# Altium footprint library main.PcbLib: 217 footprints (part 12 of 14)
Each footprint in its own frame and in the unit in brackets; x right, y up, seen from the top. Pads: shape width x height; smd on the part's side, far side on the other; paste and mask are expansions set on the pad; w line width, h text height; cw(c..) or ccw(c..) is an arc to the next point about the centre after c.
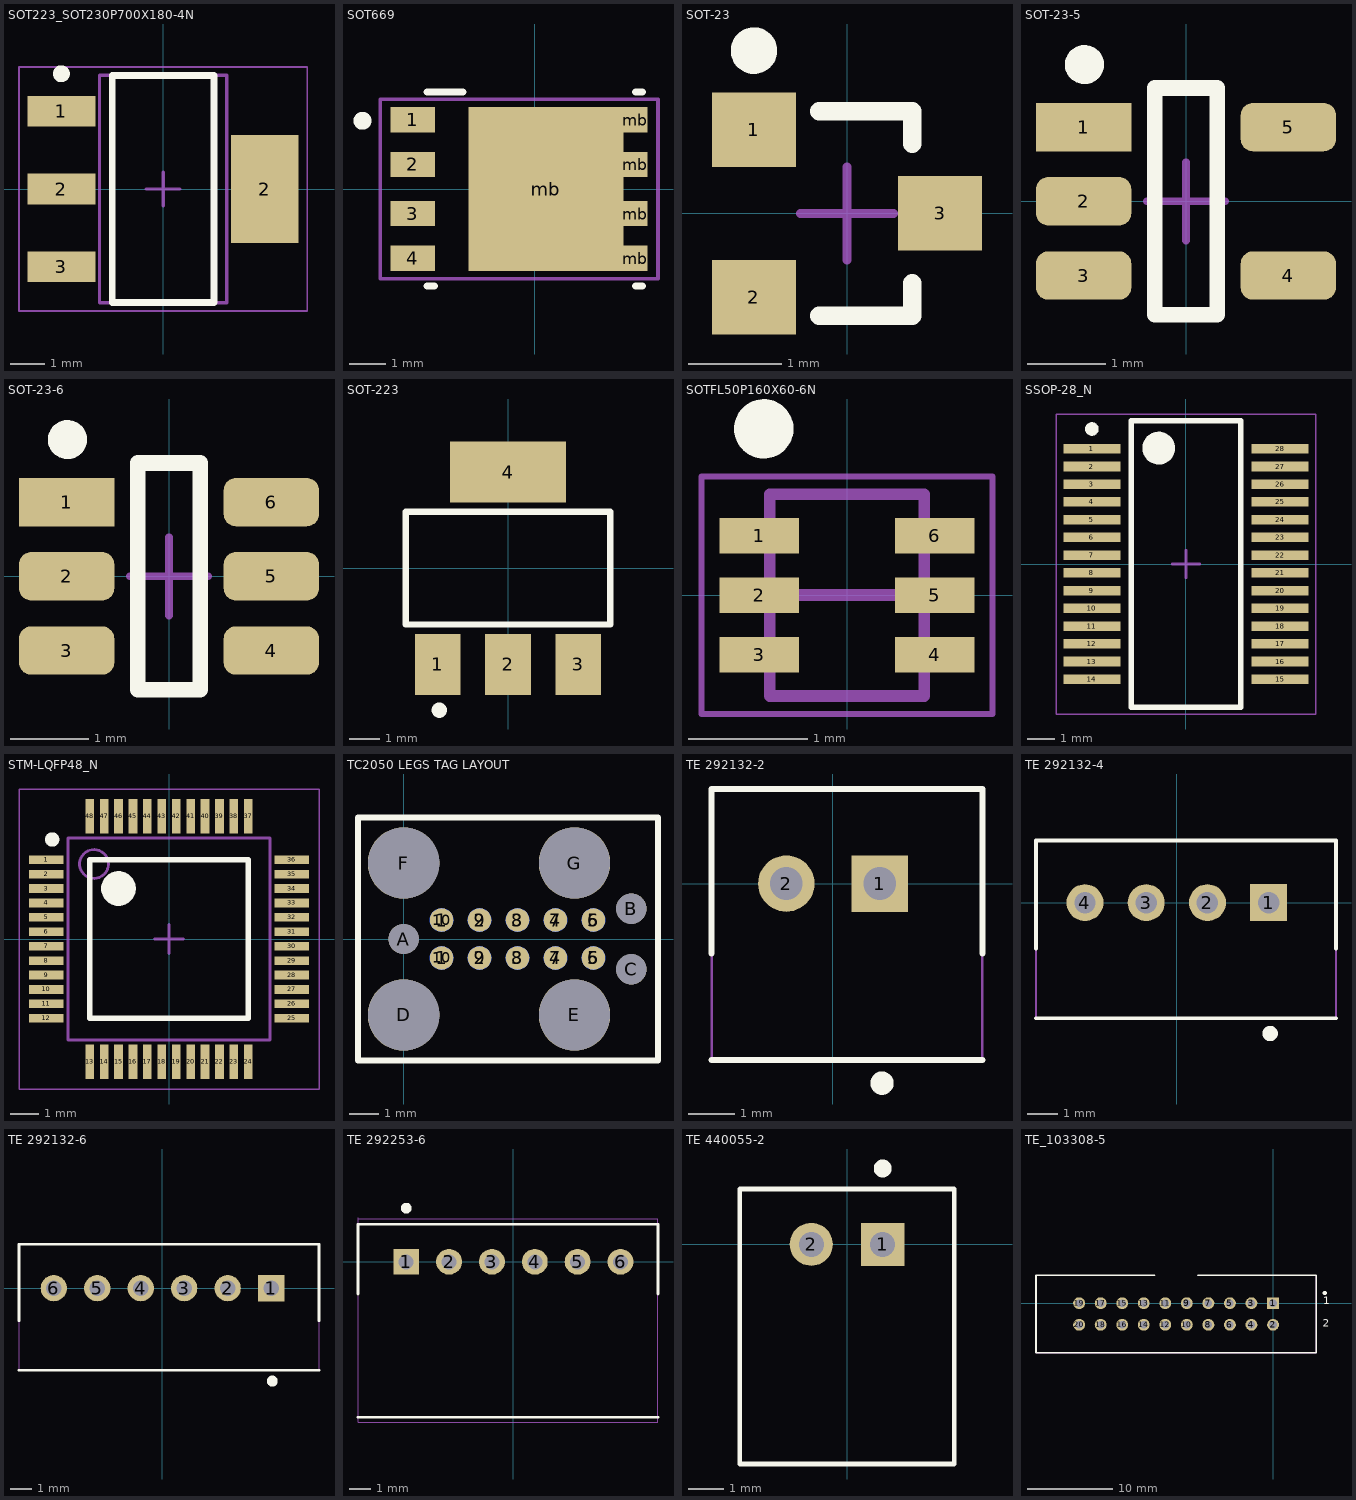
[diagram p11: the footprints below, top view; thin cyan lines are the x and y axes]

## SOT223_SOT230P700X180-4N [mm] "SOT223, 4-Leads, Body 6.50x7.00mm (avg), Pitch 2.30mm, IPC Medium Density"
height 1.8
pads (4):
  rect 2x0.9 smd: 1(-3,2.3) 2(-3,0) 3(-3,-2.3)
  rect 2x3.2 smd: 2(3,0)
Top Overlay:
  circle w0.25: c-3,3.4 r0.125
  lines w0.2: -1.5,-3.35 -1.5,3.35 1.5,3.35 1.5,-3.35 -1.5,-3.35
Mechanical 7:
  text ".Designator" at -2.286,-0.508 h1.52
Mechanical 13:
  lines w0.1: -1.875,-3.35 -1.875,3.35 1.875,3.35 1.875,-3.35 -1.875,-3.35
Mechanical 15:
  lines w0.05: -4.25,-3.6 -4.25,3.6 4.25,3.6 4.25,-3.6 -4.25,-3.6
  lines w0.1: -0.5,0 0.5,0 ; 0,-0.5 0,0.5
3D body: height 1.8, standoff 0.02, extent -1.875,-3.35 1.875,3.35

## SOT669 [mm] "SOT669"
height 0.025
pads (9):
  rect 1.25x0.7 smd paste-0.09: 1(-3.4,1.93) 2(-3.4,0.685) 3(-3.4,-0.685) 4(-3.4,-1.93)
  rect 4.32x4.56 smd paste+0: mb(0.308,0)
  rect 0.68x0.7 smd paste-0.09: mb(2.795,-1.93) mb(2.795,-0.685) mb(2.795,0.685) mb(2.795,1.93)
Top Overlay:
  circle w0.25: c-4.8,1.9 r0.125
  lines w0.2: -3,-2.7 -2.8,-2.7 ; -3,2.7 -2,2.7 ; 2.8,-2.7 3,-2.7 ; 2.8,2.7 3,2.7
Top Paste:
  rectangle: -1.392,0.385 0.193,1.955
  rectangle: -1.392,-1.955 0.193,-0.385
  rectangle: 0.693,0.385 1.927,1.955
  rectangle: 0.693,-1.955 1.927,-0.385
Top Solder:
  region: 2.25,-0.43 2.25,-0.84 2.475,-0.84 2.475,-0.43
  region: 2.25,-1.7 2.25,-2.11 2.475,-2.11 2.475,-1.7
  region: 2.25,2.11 2.25,1.7 2.475,1.7 2.475,2.11
  region: 2.25,0.84 2.25,0.43 2.475,0.43 2.475,0.84
  region: -1.189,-2.193 -1.19,-2.183 -1.19,2.183 -1.189,2.193 -1.186,2.203 -1.181,2.212 -1.175,2.22 -1.167,2.226 -1.158,2.231 -1.148,2.234 -1.138,2.235 2.238,2.235 2.248,2.234 2.258,2.231 2.267,2.226 2.275,2.22 2.281,2.212 2.286,2.203 2.289,2.193 2.29,2.183 2.29,-2.183 2.289,-2.193 2.286,-2.203 2.281,-2.212 2.275,-2.22 2.267,-2.226 2.258,-2.231 2.248,-2.234 2.238,-2.235 -1.138,-2.235 -1.148,-2.234 -1.158,-2.231 -1.167,-2.226 -1.175,-2.22 -1.181,-2.212 -1.186,-2.203
Mechanical 7:
  text ".Designator" at -2.413,-1.778 h1.52
Mechanical 15:
  lines w0.1: -4.3,-2.5 -4.3,2.5 3.429,2.5 3.429,-2.5 -4.3,-2.5
3D body "SOT669.step": height 1, standoff 0, extent -3.3,-2.405 2.81,2.405

## SOT-23 [mm]
height 1.1
pads (3):
  rect 0.9x0.8 smd: 1(-1,0.9) 2(-1,-0.9) 3(1,0)
Top Overlay:
  circle w0.25: c-1,1.75 r0.125
  lines w0.2: -0.3,-1.1 0.7,-1.1 0.7,-0.75 ; -0.3,1.1 0.7,1.1 0.7,0.75
Mechanical 15:
  lines w0.1: -0.5,0 0.5,0 ; 0,-0.5 0,0.5
3D body "SW3DPS-SOT-23-DEFAULT.STEP": height 1.05, standoff -0.05, extent -1.25,-1.5 1.25,1.5

## SOT-23-5 [mm]
height 1.1
pads (5):
  rect 1.22x0.62 smd: 1(-1.31,0.95)
  rrect50% 1.22x0.62 smd: 2(-1.31,0) 3(-1.31,-0.95) 4(1.31,-0.95) 5(1.31,0.95)
Top Overlay:
  circle w0.25: c-1.3,1.75 r0.125
  lines w0.2: -0.4,-1.45 0.4,-1.45 0.4,1.45 -0.4,1.45 -0.4,-1.45
Mechanical 15:
  lines w0.1: -0.5,0 0.5,0 ; 0,-0.5 0,0.5
3D body "User Library-SOT23-5-2.STEP": height 1.45, standoff 0, extent -1.4,-1.45 1.4,1.45

## SOT-23-6 [mm]
height 1.1
pads (6):
  rect 1.22x0.62 smd: 1(-1.31,0.95)
  rrect50% 1.22x0.62 smd: 2(-1.31,0) 3(-1.31,-0.95) 4(1.31,-0.95) 5(1.31,0) 6(1.31,0.95)
Top Overlay:
  circle w0.25: c-1.3,1.75 r0.125
  lines w0.2: -0.4,-1.45 -0.4,1.45 0.4,1.45 0.4,-1.45 -0.4,-1.45
Mechanical 15:
  lines w0.1: -0.5,0 0.5,0 ; 0,-0.5 0,0.5
3D body "User Library-SOT23-6-2.STEP": height 1.45, standoff 0, extent -1.4,-1.45 1.4,1.45

## SOT-223 [mm]
height 1.1
pads (4):
  rect 1.5x2 smd: 1(-2.3,-3.15) 2(0,-3.15) 3(2.3,-3.15)
  rect 3.8x2 smd: 4(0,3.15)
Top Overlay:
  circle w0.25: c-2.25,-4.65 r0.125
  lines w0.2: -3.35,-1.85 -3.35,1.85 3.35,1.85 3.35,-1.85 -3.35,-1.85
Mechanical 15:
  lines w0.1: -0.5,-3.15 0.5,-3.15 ; 0,-3.65 0,-2.65
3D body "User Library-SOT-223-4.STEP": height 1.65, standoff 0, extent -3.25,-3.543 3.25,3.544

## SOTFL50P160X60-6N [mm] "SOTFL, 6-Leads, Body 1.60x1.60mm, Pitch 0.50mm, IPC Medium Density"
height 0.6
pads (6):
  rect 0.67x0.3 smd: 1(-0.74,0.5) 2(-0.74,0) 3(-0.74,-0.5) 4(0.74,-0.5) 5(0.74,0) 6(0.74,0.5)
Top Overlay:
  circle w0.25: c-0.7,1.4 r0.125
Mechanical 7:
  text ".Designator" at -0.74,-0.5 h0.6
Mechanical 13:
  lines w0.1: -0.65,-0.85 0.65,-0.85 0.65,0.85 -0.65,0.85 -0.65,-0.85
Mechanical 15:
  lines w0.05: -1.225,-1 1.225,-1 1.225,1 -1.225,1 -1.225,-1
  lines w0.1: -0.5,0 0.5,0
3D body: height 0.6, standoff 0, extent -0.65,-0.85 0.65,0.85

## SSOP-28_N [mm] "SOP, 28-Leads, Body 10.2x5.3mm, Pitch 0.65mm, IPC Medium Density"
height 2
pads (28):
  rect 2.1x0.35 smd: 1(-3.45,4.225) 2(-3.45,3.575) 3(-3.45,2.925) 4(-3.45,2.275) 5(-3.45,1.625) 6(-3.45,0.975) 7(-3.45,0.325) 8(-3.45,-0.325) 9(-3.45,-0.975) 10(-3.45,-1.625) 11(-3.45,-2.275) 12(-3.45,-2.925) 13(-3.45,-3.575) 14(-3.45,-4.225) 15(3.45,-4.225) 16(3.45,-3.575) 17(3.45,-2.925) 18(3.45,-2.275) 19(3.45,-1.625) 20(3.45,-0.975) 21(3.45,-0.325) 22(3.45,0.325) 23(3.45,0.975) 24(3.45,1.625) 25(3.45,2.275) 26(3.45,2.925) 27(3.45,3.575) 28(3.45,4.225)
Top Overlay:
  circle w0.25: c-3.45,4.95 r0.125
  circle w0.6: c-1,4.25 r0.3
  lines w0.2: -2,-5.25 -2,5.25 2,5.25 2,-5.25 -2,-5.25
Mechanical 7:
  text ".Designator" at -0.827,-0.953 h0.76
Mechanical 15:
  lines w0.05: -4.75,-5.5 -4.75,5.5 4.75,5.5 4.75,-5.5 -4.75,-5.5
  lines w0.1: -0.5,0 0.5,0 ; 0,-0.5 0,0.5
3D body "User Library-ssop28_model.STEP": height 1.96, standoff -0.04, extent -3.928,-5.071 3.872,5.129

## STM-LQFP48_N [mm] "QFP, 48-Leads, Body 7x7mm, Pitch 0.5mm, IPC Medium Density"
height 1.6
pads (48):
  rect 1.2x0.3 smd: 1(-4.25,2.75) 2(-4.25,2.25) 3(-4.25,1.75) 4(-4.25,1.25) 5(-4.25,0.75) 6(-4.25,0.25) 7(-4.25,-0.25) 8(-4.25,-0.75) 9(-4.25,-1.25) 10(-4.25,-1.75) 11(-4.25,-2.25) 12(-4.25,-2.75) 25(4.25,-2.75) 26(4.25,-2.25) 27(4.25,-1.75) 28(4.25,-1.25) 29(4.25,-0.75) 30(4.25,-0.25) 31(4.25,0.25) 32(4.25,0.75) 33(4.25,1.25) 34(4.25,1.75) 35(4.25,2.25) 36(4.25,2.75)
  rect 0.3x1.2 smd: 13(-2.75,-4.25) 14(-2.25,-4.25) 15(-1.75,-4.25) 16(-1.25,-4.25) 17(-0.75,-4.25) 18(-0.25,-4.25) 19(0.25,-4.25) 20(0.75,-4.25) 21(1.25,-4.25) 22(1.75,-4.25) 23(2.25,-4.25) 24(2.75,-4.25) 37(2.75,4.25) 38(2.25,4.25) 39(1.75,4.25) 40(1.25,4.25) 41(0.75,4.25) 42(0.25,4.25) 43(-0.25,4.25) 44(-0.75,4.25) 45(-1.25,4.25) 46(-1.75,4.25) 47(-2.25,4.25) 48(-2.75,4.25)
Top Overlay:
  circle w0.25: c-4.05,3.45 r0.125
  circle w0.6: c-1.75,1.75 r0.3
  lines w0.2: -2.75,-2.75 -2.75,2.75 2.75,2.75 2.75,-2.75 -2.75,-2.75
Mechanical 7:
  text ".Designator" at -2.166,-1.342 h0.76
Mechanical 13:
  circle w0.1: c-2.6,2.6 r0.5
  lines w0.1: -3.5,-3.5 -3.5,3.5 3.5,3.5 3.5,-3.5 -3.5,-3.5
Mechanical 15:
  lines w0.05: -5.2,-5.2 -5.2,5.2 5.2,5.2 5.2,-5.2 -5.2,-5.2
  lines w0.1: -0.5,0 0.5,0 ; 0,-0.5 0,0.5
3D body "User Library-LQFP48_Grid_0_5.STEP": height 1.6, standoff 0, extent -4.5,-4.5 4.5,4.5

## TC2050 LEGS TAG LAYOUT [mil]
height 1
pads (27):
  round 31 smd paste-31: 1(50,-25) 2(100,-25) 3(150,-25) 4(200,-25) 5(250,-25) 6(250,25) 7(200,25) 8(150,25) 9(100,25) 10(50,25)
  round 31 smd far side paste-31: 1(50,25) 2(100,25) 3(150,25) 4(200,25) 5(250,25) 6(250,-25) 7(200,-25) 8(150,-25) 9(100,-25) 10(50,-25)
  round 40 hole 40 unplated: A(0,0) B(300,40) C(300,-40)
  round 94 hole 94 unplated: D(0,-100) E(225,-100) F(0,100) G(225,100)
Top Overlay:
  lines w7.87: -60,-160 -60,160 335,160 335,-160 -60,-160
Mechanical 7:
  text ".Designator" at 66.93,-78.74 h30

## TE 292132-2 [mm] "TE 292132-2"
pads (2):
  rect 1.208x1.208 hole 0.7: 1(1,0)
  round 1.208 hole 0.7: 2(-1,0)
Top Overlay:
  circle w0.25: c1.05,-4.275 r0.125
  lines w0.127: -2.6,-3.775 3.2,-3.775 ; -2.6,-1.5 -2.6,2.025 3.2,2.025 3.2,-1.5
Mechanical 7:
  text ".Designator" at -4.548,-1.037 h1.52
Mechanical 15:
  lines w0.05: -2.6,-3.775 -2.6,2.025 3.2,2.025 3.2,-3.775 -2.6,-3.775
3D body "c-292132-2-b1-3d.stp": height 6.8, standoff -3.2, extent -2.6,-3.775 3.2,2.025

## TE 292132-4 [mm] "TE 292132-4"
pads (4):
  rect 1.208x1.208 hole 0.7: 1(3,0)
  round 1.208 hole 0.7: 2(1,0) 3(-1,0) 4(-3,0)
Top Overlay:
  circle w0.25: c3.05,-4.275 r0.125
  lines w0.127: -4.6,-3.775 5.2,-3.775 ; -4.6,-1.5 -4.6,2.025 5.2,2.025 5.2,-1.5
Mechanical 7:
  text ".Designator" at -2.548,-1.037 h1.52
Mechanical 15:
  lines w0.05: -4.6,-3.775 -4.6,2.025 5.2,2.025 5.2,-3.775 -4.6,-3.775
3D body "c-292132-4-b1-3d.stp": height 6.8, standoff -3.2, extent -4.6,-3.775 5.2,2.025

## TE 292132-6 [mm] "TE 292132-6"
pads (6):
  rect 1.208x1.208 hole 0.7: 1(5,0)
  round 1.208 hole 0.7: 2(3,0) 3(1,0) 4(-1,0) 5(-3,0) 6(-5,0)
Top Overlay:
  circle w0.25: c5.05,-4.275 r0.125
  lines w0.127: -6.6,-3.775 7.2,-3.775 ; -6.6,-1.5 -6.6,2.025 7.2,2.025 7.2,-1.5
Mechanical 7:
  text ".Designator" at -0.548,-1.037 h1.52
Mechanical 15:
  lines w0.05: -6.6,-3.775 -6.6,2.025 ; -2.6,-3.775 7.2,-3.775 7.2,2.025 -2.6,2.025
3D body "c-292132-6-b1-3d.stp": height 6.8, standoff -3.2, extent -6.6,-3.775 7.2,2.025

## TE 292253-6 [mm] "TE 292253-6"
pads (6):
  rect 1.208x1.208 hole 0.7: 1(-5,0)
  round 1.208 hole 0.7: 2(-3,0) 3(-1,0) 4(1,0) 5(3,0) 6(5,0)
Top Overlay:
  circle w0.25: c-5,2.5 r0.125
  lines w0.127: -7.25,-7.25 6.75,-7.25 ; -7.25,-1.5 -7.25,1.75 6.75,1.75 6.75,-1.5
Mechanical 7:
  text ".Designator" at -8.25,-1.5 h1.52
Mechanical 15:
  lines w0.05: -7.25,2 6.75,2 6.75,-7.5 -7.25,-7.5 -7.25,2.05
3D body "c-292253-6-b1-3d.stp": height 4, standoff -3.2, extent -7.15,-7.1 6.65,1.7

## TE 440055-2 [mm] "TE 440055-2"
pads (2):
  rect 1.208x1.208 hole 0.7: 1(1,0)
  round 1.208 hole 0.7: 2(-1,0)
Top Overlay:
  circle w0.25: c1,2.125 r0.125
  lines w0.127: 3,-6.15 -3,-6.15 -3,1.55 3,1.55 3,-6.125
Mechanical 7:
  text ".Designator" at -4.548,-1.037 h1.52
Mechanical 15:
  lines w0.05: -3,-6.15 -3,1.55 3,1.55 3,-6.15 -3,-6.15
3D body "c-440055-2-b3-3d.stp": height 5.07, standoff -3.27, extent -3,-6.15 3,1.55

## TE_103308-5 [mil]
pads (20):
  rect 55x55 hole 35: 1(0,0)
  round 55 hole 35: 2(0,-100) 3(-100,0) 4(-100,-100) 5(-200,0) 6(-200,-100) 7(-300,0) 8(-300,-100) 9(-400,0) 10(-400,-100) 11(-500,0) 12(-500,-100) 13(-600,0) 14(-600,-100) 15(-700,0) 16(-700,-100) 17(-800,0) 18(-800,-100) 19(-900,0) 20(-900,-100)
Top Overlay:
  circle w9.84: c240.16,47.24 r4.92
  lines w7.87: -550,130 -1100,130 -1100,-230 200,-230 200,130 -350,130
  text "1" at 232.28,-15.75 h60
  text "2" at 229.77,-120.7 h60
Mechanical 7:
  text ".Designator" at -596.92,-64.79 h30
Mechanical 15:
  lines w5: -350,130 200,130 ; -1100,-230 -1100,130 ; -1100,-230 -1100,130 ; -1100,-230 200,-230 ; -1100,-230 200,-230 ; -1100,130 -550,130 -1100,130 ; 200,-230 200,130 ; 200,-230 200,130
3D body "c-103308-5-l-3d.stp": height 390, standoff -118, extent -1105,-234.99 195,125.01